# Altium footprint library Connectors THD.PcbLib: 631 footprints (part 4 of 46)
Each footprint in its own frame and in the unit in brackets; x right, y up, seen from the top. Pads: shape width x height; smd on the part's side, far side on the other; paste and mask are expansions set on the pad; w line width, h text height; cw(c..) or ccw(c..) is an arc to the next point about the centre after c.
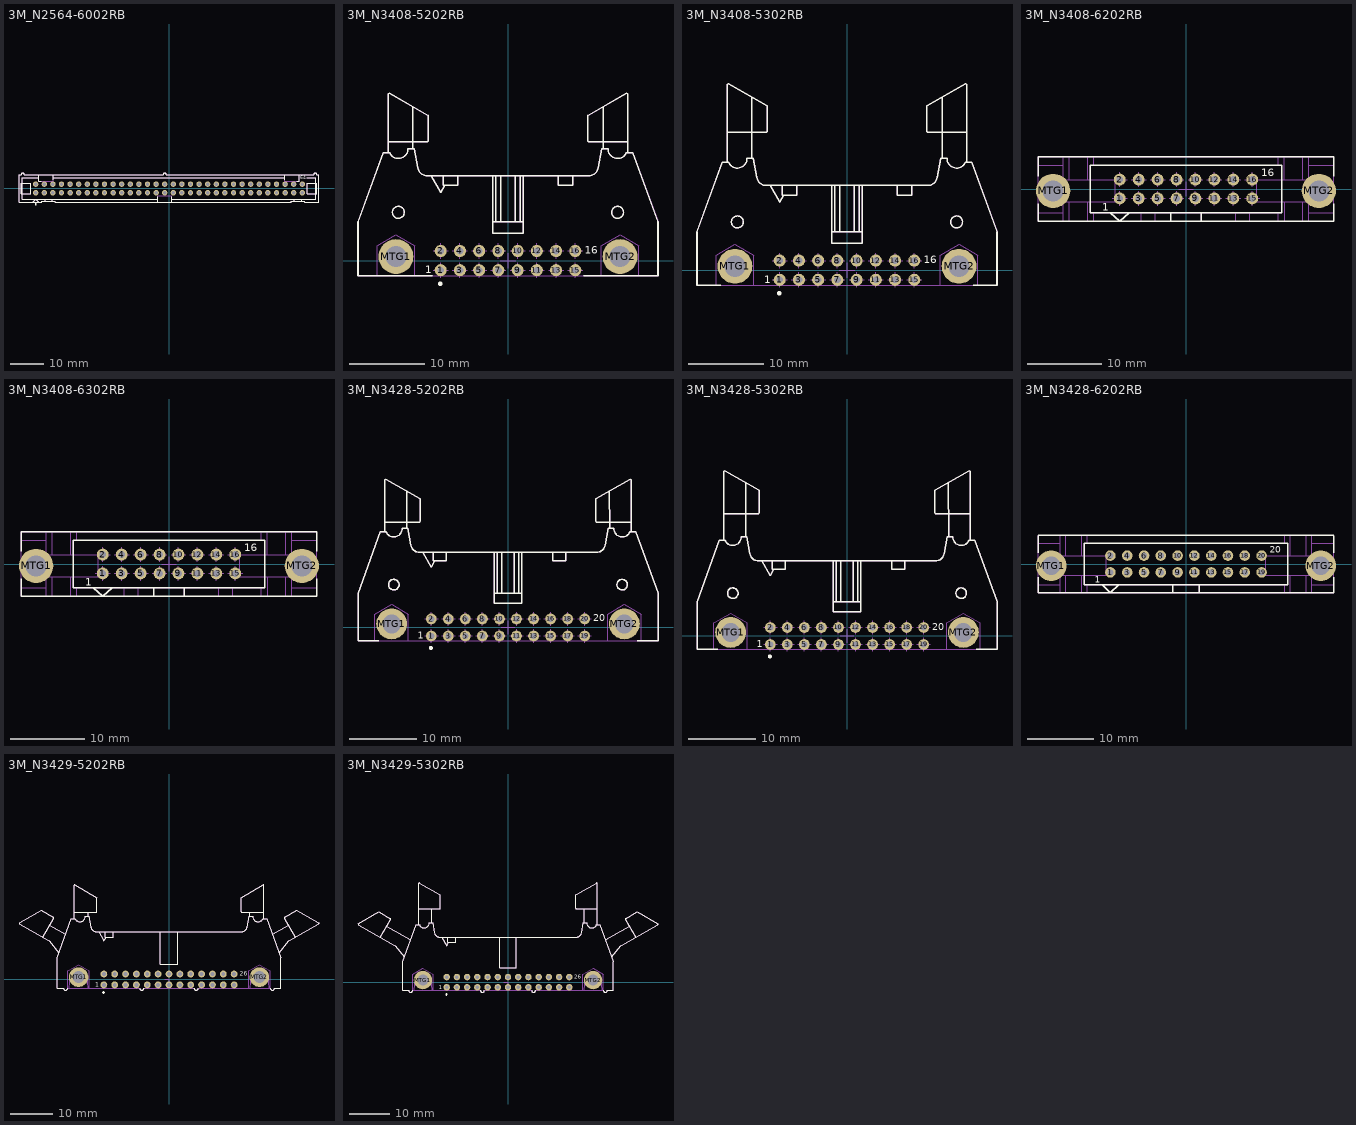
[diagram p3: the footprints below, top view; thin cyan lines are the x and y axes]

## 3M_N2564-6002RB [mm] "64 Contacts - Straight .100\" x .100\" Low Profile Four-Wall Header"
height 10.03
pads (64):
  round 1.6 hole 1: 1(-39.37,-1.27) 2(-39.37,1.27) 3(-36.83,-1.27) 4(-36.83,1.27) 5(-34.29,-1.27) 6(-34.29,1.27) 7(-31.75,-1.27) 8(-31.75,1.27) 9(-29.21,-1.27) 10(-29.21,1.27) 11(-26.67,-1.27) 12(-26.67,1.27) 13(-24.13,-1.27) 14(-24.13,1.27) 15(-21.59,-1.27) 16(-21.59,1.27) 17(-19.05,-1.27) 18(-19.05,1.27) 19(-16.51,-1.27) 20(-16.51,1.27) 21(-13.97,-1.27) 22(-13.97,1.27) 23(-11.43,-1.27) 24(-11.43,1.27) 25(-8.89,-1.27) 26(-8.89,1.27) 27(-6.35,-1.27) 28(-6.35,1.27) 29(-3.81,-1.27) 30(-3.81,1.27) 31(-1.27,-1.27) 32(-1.27,1.27) 33(1.27,-1.27) 34(1.27,1.27) 35(3.81,-1.27) 36(3.81,1.27) 37(6.35,-1.27) 38(6.35,1.27) 39(8.89,-1.27) 40(8.89,1.27) 41(11.43,-1.27) 42(11.43,1.27) 43(13.97,-1.27) 44(13.97,1.27) 45(16.51,-1.27) 46(16.51,1.27) 47(19.05,-1.27) 48(19.05,1.27) 49(21.59,-1.27) 50(21.59,1.27) 51(24.13,-1.27) 52(24.13,1.27) 53(26.67,-1.27) 54(26.67,1.27) 55(29.21,-1.27) 56(29.21,1.27) 57(31.75,-1.27) 58(31.75,1.27) 59(34.29,-1.27) 60(34.29,1.27) 61(36.83,-1.27) 62(36.83,1.27) 63(39.37,-1.27) 64(39.37,1.27)
Top Overlay:
  circle w0.3: c-39.37,-4.699 r0.15
  lines w0.2: -43.282,-1.603 -40.869,-1.603 -40.869,1.603 -43.282,1.603 ; -43.282,-1.524 -43.586,-1.524 -43.586,1.524 -43.282,1.524 ; -40.234,-4.064 -39.37,-3.2 -38.506,-4.064 ; -38.418,3.15 -43.282,3.15 -43.282,-3.2 -3.366,-3.2 ; -38.418,4.064 -38.418,2.159 -37.709,2.159 ; -36.601,-3.835 -36.601,-3.2 ; -34.519,-3.835 -34.519,-3.2 ; -34.227,2.518 -34.227,4.064 ; -34.227,3.15 34.227,3.15 ; -3.366,-4.064 -3.366,-2.438 ; 0.826,-4.064 0.826,-2.438 ; 0.826,-3.2 43.282,-3.2 43.282,3.15 40.64,3.15 ; 34.227,2.518 34.227,4.064 ; 37.059,-3.835 37.059,-3.2 ; 37.709,2.159 38.418,2.159 38.418,4.064 ; 39.141,-3.835 39.141,-3.2 ; 43.282,-1.603 40.869,-1.603 40.869,1.603 43.282,1.603 ; 43.282,-1.524 43.586,-1.524 43.586,1.524 43.282,1.524 ; -44.298,-4.064 -37.592,-4.064 -37.592,-3.835 -33.528,-3.835 -33.528,-4.064 36.068,-4.064 36.068,-3.835 40.132,-3.835 40.132,-4.064 44.298,-4.064 44.298,4.064 43.637,4.064 ccw(c43.18,4.064) 42.723,4.064 -0.813,4.064 ccw(c-1.27,4.064) -1.727,4.064 -42.723,4.064 ccw(c-43.18,4.064) -43.637,4.064 -44.298,4.064 -44.298,-4.064
  text "64" at 38.735,2.667 h1.02
Mechanical 14:
  lines w0.1: -43.282,-1.603 -40.869,-1.603 -40.869,1.603 -43.282,1.603 ; -43.282,-1.524 -43.586,-1.524 -43.586,1.524 -43.282,1.524 ; -40.234,-4.064 -39.37,-3.2 -38.506,-4.064 ; -38.418,3.15 -43.282,3.15 -43.282,-3.2 -3.366,-3.2 ; -38.418,4.064 -38.418,2.159 -34.227,2.159 -34.227,4.064 ; -36.601,-3.835 -36.601,-3.2 ; -34.519,-3.835 -34.519,-3.2 ; -34.227,3.15 34.227,3.15 ; -3.366,-4.064 -3.366,-2.159 0.826,-2.159 0.826,-4.064 ; 0.826,-3.2 43.282,-3.2 43.282,3.15 40.64,3.15 ; 34.227,4.064 34.227,2.159 38.418,2.159 38.418,4.064 ; 37.059,-3.835 37.059,-3.2 ; 39.141,-3.835 39.141,-3.2 ; 43.282,-1.603 40.869,-1.603 40.869,1.603 43.282,1.603 ; 43.282,-1.524 43.586,-1.524 43.586,1.524 43.282,1.524 ; -44.298,-4.064 -37.592,-4.064 -37.592,-3.835 -33.528,-3.835 -33.528,-4.064 36.068,-4.064 36.068,-3.835 40.132,-3.835 40.132,-4.064 44.298,-4.064 44.298,4.064 43.637,4.064 ccw(c43.18,4.064) 42.723,4.064 -0.813,4.064 ccw(c-1.27,4.064) -1.727,4.064 -42.723,4.064 ccw(c-43.18,4.064) -43.637,4.064 -44.298,4.064 -44.298,-4.064
  text "64" at 38.735,2.667 h1.02
3D body: height 9.65, standoff -2.59, extent -44.298,-4.064 44.298,4.572

## 3M_N3408-5202RB [mm] "3M, 3000 Series, 16 Contacts - Pitch 2.54mm - Right Angle Four-Wall Header (Black) With Short Roll Pin Latch/Ejectors"
height 8.6
pads (18):
  round 1.6 hole 0.9: 1(-8.89,-1.27) 2(-8.89,1.27) 3(-6.35,-1.27) 4(-6.35,1.27) 5(-3.81,-1.27) 6(-3.81,1.27) 7(-1.27,-1.27) 8(-1.27,1.27) 9(1.27,-1.27) 10(1.27,1.27) 11(3.81,-1.27) 12(3.81,1.27) 13(6.35,-1.27) 14(6.35,1.27) 15(8.89,-1.27) 16(8.89,1.27)
  round 4.6 hole 2.8: MTG1(-14.796,0.533) MTG2(14.796,0.533)
Top Overlay:
  circle w0.2: c14.478,6.375 r0.787
  circle w0.2: c-14.478,6.375 r0.787
  circle w0.3: c-8.963,-3.048 r0.15
  lines w0.2: -15.799,14.249 -15.799,22.024 -15.646,22.112 -10.541,19.164 -10.541,15.799 -10.643,15.697 -15.799,15.697 ; -12.573,14.757 -12.573,20.337 ; -10.154,11.201 -8.884,9.002 -8.347,9.931 ; -10,-2.007 -19.812,-2.007 -19.812,5.105 -16.484,14.249 -15.642,14.249 ccw(c-14.478,14.757) -13.208,14.757 -12.366,14.757 -11.924,12.251 ccw(c-10.673,12.471) -10.673,11.201 10.673,11.201 ccw(c10.673,12.471) 11.924,12.251 12.366,14.757 13.208,14.757 ccw(c14.478,14.757) 15.642,14.249 16.484,14.249 19.812,5.105 19.812,-2.007 10,-2.007 ; -8.579,11.201 -8.579,9.931 -6.661,9.931 -6.668,11.201 ; -2.032,5.105 2.032,5.105 ; -2.032,11.201 -2.032,3.581 2.032,3.581 2.032,11.201 ; -1.587,5.105 -1.587,11.201 ; -0.953,5.105 -0.953,11.201 ; 0.953,5.105 0.953,11.201 ; 1.587,5.105 1.587,11.201 ; 6.668,11.201 6.661,9.931 8.579,9.931 8.573,11.201 ; 12.58,14.757 12.58,20.341 ; 15.799,14.249 15.799,22.024 15.646,22.112 10.541,19.164 10.541,15.799 10.643,15.697 15.799,15.697
  text "1" at -10.922,-1.7 h1.02
  text "16" at 10.15,0.889 h1.02
Mechanical 8:
  lines w0.1: -15.796,0.533 -14.796,0.533 ; -14.796,-0.467 -14.796,0.533 ; -14.796,1.533 -14.796,0.533 ; -13.796,0.533 -14.796,0.533 ; -9.89,-1.27 -8.89,-1.27 ; -9.89,1.27 -8.89,1.27 ; -8.89,-2.27 -8.89,-1.27 ; -8.89,-0.27 -8.89,-1.27 ; -8.89,0.27 -8.89,1.27 ; -8.89,2.27 -8.89,1.27 ; -7.89,-1.27 -8.89,-1.27 ; -7.89,1.27 -8.89,1.27 ; -7.35,-1.27 -6.35,-1.27 ; -7.35,1.27 -6.35,1.27 ; -6.35,-2.27 -6.35,-1.27 ; -6.35,-0.27 -6.35,-1.27 ; -6.35,0.27 -6.35,1.27 ; -6.35,2.27 -6.35,1.27 ; -5.35,-1.27 -6.35,-1.27 ; -5.35,1.27 -6.35,1.27 ; -4.81,-1.27 -3.81,-1.27 ; -4.81,1.27 -3.81,1.27 ; -3.81,-2.27 -3.81,-1.27 ; -3.81,-0.27 -3.81,-1.27 ; -3.81,0.27 -3.81,1.27 ; -3.81,2.27 -3.81,1.27 ; -2.81,-1.27 -3.81,-1.27 ; -2.81,1.27 -3.81,1.27 ; -2.27,-1.27 -1.27,-1.27 ; -2.27,1.27 -1.27,1.27 ; -1.27,-2.27 -1.27,-1.27 ; -1.27,-0.27 -1.27,-1.27 ; -1.27,0.27 -1.27,1.27 ; -1.27,2.27 -1.27,1.27 ; -1,0 0,0 ; -0.27,-1.27 -1.27,-1.27 ; -0.27,1.27 -1.27,1.27 ; 0,-1 0,0 ; 0,1 0,0 ; 0.27,-1.27 1.27,-1.27 ; 0.27,1.27 1.27,1.27 ; 1,0 0,0 ; 1.27,-2.27 1.27,-1.27 ; 1.27,-0.27 1.27,-1.27 ; 1.27,0.27 1.27,1.27 ; 1.27,2.27 1.27,1.27 ; 2.27,-1.27 1.27,-1.27 ; 2.27,1.27 1.27,1.27 ; 2.81,-1.27 3.81,-1.27 ; 2.81,1.27 3.81,1.27 ; 3.81,-2.27 3.81,-1.27 ; 3.81,-0.27 3.81,-1.27 ; 3.81,0.27 3.81,1.27 ; 3.81,2.27 3.81,1.27 ; 4.81,-1.27 3.81,-1.27 ; 4.81,1.27 3.81,1.27 ; 5.35,-1.27 6.35,-1.27 ; 5.35,1.27 6.35,1.27 ; 6.35,-2.27 6.35,-1.27 ; 6.35,-0.27 6.35,-1.27 ; 6.35,0.27 6.35,1.27 ; 6.35,2.27 6.35,1.27 ; 7.35,-1.27 6.35,-1.27 ; 7.35,1.27 6.35,1.27 ; 7.89,-1.27 8.89,-1.27 ; 7.89,1.27 8.89,1.27 ; 8.89,-2.27 8.89,-1.27 ; 8.89,-0.27 8.89,-1.27 ; 8.89,0.27 8.89,1.27 ; 8.89,2.27 8.89,1.27 ; 9.89,-1.27 8.89,-1.27 ; 9.89,1.27 8.89,1.27 ; 13.796,0.533 14.796,0.533 ; 14.796,-0.467 14.796,0.533 ; 14.796,1.533 14.796,0.533 ; 15.796,0.533 14.796,0.533
Mechanical 14:
  circle w0.1: c-14.796,0.533 r1.27
  circle w0.1: c14.796,0.533 r1.27
  circle w0.1: c14.478,6.375 r0.787
  circle w0.1: c-14.478,6.375 r0.787
  lines w0.1: -17.297,-2.007 -17.297,1.978 -14.796,3.422 -12.294,1.978 -12.294,-2.007 ; -15.799,14.249 -15.799,22.024 -15.646,22.112 -10.541,19.164 -10.541,15.799 -10.643,15.697 -15.799,15.697 ; -12.573,14.757 -12.573,20.337 ; -10.154,11.201 -8.884,9.002 -8.347,9.931 ; -8.579,11.201 -8.579,9.931 -6.661,9.931 -6.668,11.201 ; -2.032,5.105 2.032,5.105 ; -2.032,11.201 -2.032,3.581 2.032,3.581 2.032,11.201 ; -1.587,5.105 -1.587,11.201 ; -0.953,5.105 -0.953,11.201 ; 0.953,5.105 0.953,11.201 ; 1.587,5.105 1.587,11.201 ; 6.668,11.201 6.661,9.931 8.579,9.931 8.573,11.201 ; 12.294,-2.007 12.294,1.978 14.796,3.422 17.297,1.978 17.297,-2.007 ; 12.58,20.341 12.597,14.757 ; 15.799,14.249 15.799,22.024 15.646,22.112 10.541,19.164 10.541,15.799 10.643,15.697 15.799,15.697 ; -19.812,-2.007 19.812,-2.007 19.812,5.105 16.484,14.249 15.642,14.249 cw(c14.478,14.757) 13.208,14.757 12.366,14.757 11.924,12.251 cw(c10.673,12.471) 10.673,11.201 -10.673,11.201 cw(c-10.673,12.471) -11.924,12.251 -12.366,14.757 -13.208,14.757 cw(c-14.478,14.757) -15.642,14.249 -16.484,14.249 -19.812,5.105 -19.812,-2.007
  text "1" at -10.922,-1.7 h1.02
  text "16" at 10.15,0.889 h1.02
3D body: height 8.64, standoff -3.94, extent -19.812,-2.007 19.812,22.125

## 3M_N3408-5302RB [mm] "3M, 3000 Series, 16 Contacts - Pitch 2.54mm - Right Angle Four-Wall Header (Black) With Long Roll Pin Latch/Ejectors"
height 8.6
pads (18):
  round 1.6 hole 0.9: 1(-8.89,-1.27) 2(-8.89,1.27) 3(-6.35,-1.27) 4(-6.35,1.27) 5(-3.81,-1.27) 6(-3.81,1.27) 7(-1.27,-1.27) 8(-1.27,1.27) 9(1.27,-1.27) 10(1.27,1.27) 11(3.81,-1.27) 12(3.81,1.27) 13(6.35,-1.27) 14(6.35,1.27) 15(8.89,-1.27) 16(8.89,1.27)
  round 4.6 hole 2.8: MTG1(-14.796,0.533) MTG2(14.796,0.533)
Top Overlay:
  circle w0.3: c-8.963,-3.048 r0.15
  circle w0.2: c-14.478,6.375 r0.787
  circle w0.2: c14.478,6.375 r0.787
  lines w0.2: -16.7,-2.007 -19.812,-2.007 -19.812,5.105 -16.484,14.249 -15.642,14.249 ccw(c-14.478,14.757) -13.208,14.757 -12.366,14.757 -11.924,12.251 ccw(c-10.673,12.471) -10.673,11.201 10.673,11.201 ccw(c10.673,12.471) 11.924,12.251 12.366,14.757 13.208,14.757 ccw(c14.478,14.757) 15.642,14.249 16.484,14.249 19.812,5.105 19.812,-2.007 16.7,-2.007 ; -15.799,14.249 -15.799,24.561 -15.646,24.649 -10.541,21.702 -10.541,18.336 -10.643,18.235 -15.799,18.235 ; -12.573,14.757 -12.573,22.875 ; -10.154,11.201 -8.884,9.002 -8.347,9.931 ; -8.579,11.201 -8.579,9.931 -6.661,9.931 -6.668,11.201 ; -2.032,5.105 2.032,5.105 ; -2.032,11.201 -2.032,3.581 2.032,3.581 2.032,11.201 ; -1.587,5.105 -1.587,11.201 ; -0.953,5.105 -0.953,11.201 ; 0.953,5.105 0.953,11.201 ; 1.587,5.105 1.587,11.201 ; 6.668,11.201 6.661,9.931 8.579,9.931 8.573,11.201 ; 12.573,14.757 12.573,22.875 ; 15.799,14.249 15.799,24.561 15.646,24.649 10.541,21.702 10.541,18.336 10.643,18.235 15.799,18.235
  text "16" at 10.15,0.889 h1.02
  text "1" at -10.922,-1.7 h1.02
Mechanical 8:
  lines w0.1: -15.796,0.533 -14.796,0.533 ; -14.796,-0.467 -14.796,0.533 ; -14.796,1.533 -14.796,0.533 ; -13.796,0.533 -14.796,0.533 ; -9.89,-1.27 -8.89,-1.27 ; -9.89,1.27 -8.89,1.27 ; -8.89,-2.27 -8.89,-1.27 ; -8.89,-0.27 -8.89,-1.27 ; -8.89,0.27 -8.89,1.27 ; -8.89,2.27 -8.89,1.27 ; -7.89,-1.27 -8.89,-1.27 ; -7.89,1.27 -8.89,1.27 ; -7.35,-1.27 -6.35,-1.27 ; -7.35,1.27 -6.35,1.27 ; -6.35,-2.27 -6.35,-1.27 ; -6.35,-0.27 -6.35,-1.27 ; -6.35,0.27 -6.35,1.27 ; -6.35,2.27 -6.35,1.27 ; -5.35,-1.27 -6.35,-1.27 ; -5.35,1.27 -6.35,1.27 ; -4.81,-1.27 -3.81,-1.27 ; -4.81,1.27 -3.81,1.27 ; -3.81,-2.27 -3.81,-1.27 ; -3.81,-0.27 -3.81,-1.27 ; -3.81,0.27 -3.81,1.27 ; -3.81,2.27 -3.81,1.27 ; -2.81,-1.27 -3.81,-1.27 ; -2.81,1.27 -3.81,1.27 ; -2.27,-1.27 -1.27,-1.27 ; -2.27,1.27 -1.27,1.27 ; -1.27,-2.27 -1.27,-1.27 ; -1.27,-0.27 -1.27,-1.27 ; -1.27,0.27 -1.27,1.27 ; -1.27,2.27 -1.27,1.27 ; -1,0 0,0 ; -0.27,-1.27 -1.27,-1.27 ; -0.27,1.27 -1.27,1.27 ; 0,-1 0,0 ; 0,1 0,0 ; 0.27,-1.27 1.27,-1.27 ; 0.27,1.27 1.27,1.27 ; 1,0 0,0 ; 1.27,-2.27 1.27,-1.27 ; 1.27,-0.27 1.27,-1.27 ; 1.27,0.27 1.27,1.27 ; 1.27,2.27 1.27,1.27 ; 2.27,-1.27 1.27,-1.27 ; 2.27,1.27 1.27,1.27 ; 2.81,-1.27 3.81,-1.27 ; 2.81,1.27 3.81,1.27 ; 3.81,-2.27 3.81,-1.27 ; 3.81,-0.27 3.81,-1.27 ; 3.81,0.27 3.81,1.27 ; 3.81,2.27 3.81,1.27 ; 4.81,-1.27 3.81,-1.27 ; 4.81,1.27 3.81,1.27 ; 5.35,-1.27 6.35,-1.27 ; 5.35,1.27 6.35,1.27 ; 6.35,-2.27 6.35,-1.27 ; 6.35,-0.27 6.35,-1.27 ; 6.35,0.27 6.35,1.27 ; 6.35,2.27 6.35,1.27 ; 7.35,-1.27 6.35,-1.27 ; 7.35,1.27 6.35,1.27 ; 7.89,-1.27 8.89,-1.27 ; 7.89,1.27 8.89,1.27 ; 8.89,-2.27 8.89,-1.27 ; 8.89,-0.27 8.89,-1.27 ; 8.89,0.27 8.89,1.27 ; 8.89,2.27 8.89,1.27 ; 9.89,-1.27 8.89,-1.27 ; 9.89,1.27 8.89,1.27 ; 13.796,0.533 14.796,0.533 ; 14.796,-0.467 14.796,0.533 ; 14.796,1.533 14.796,0.533 ; 15.796,0.533 14.796,0.533
Mechanical 14:
  circle w0.1: c-14.478,6.375 r0.787
  circle w0.1: c14.478,6.375 r0.787
  circle w0.1: c14.796,0.533 r1.27
  circle w0.1: c-14.796,0.533 r1.27
  lines w0.1: -17.297,-2.007 -17.297,1.978 -14.796,3.422 -12.294,1.978 -12.294,-2.007 ; -15.799,14.249 -15.799,24.561 -15.646,24.649 -10.541,21.702 -10.541,18.336 -10.643,18.235 -15.799,18.235 ; -12.573,14.757 -12.573,22.875 ; -10.154,11.201 -8.884,9.002 -8.347,9.931 ; -8.579,11.201 -8.579,9.931 -6.661,9.931 -6.668,11.201 ; -2.032,5.105 2.032,5.105 ; -2.032,11.201 -2.032,3.581 2.032,3.581 2.032,11.201 ; -1.587,5.105 -1.587,11.201 ; -0.953,5.105 -0.953,11.201 ; 0.953,5.105 0.953,11.201 ; 1.587,5.105 1.587,11.201 ; 6.668,11.201 6.661,9.931 8.579,9.931 8.573,11.201 ; 12.294,-2.007 12.294,1.978 14.796,3.422 17.297,1.978 17.297,-2.007 ; 12.573,22.875 12.597,14.757 ; 15.799,14.249 15.799,24.561 15.646,24.649 10.541,21.702 10.541,18.336 10.643,18.235 15.799,18.235 ; -19.812,-2.007 -19.812,5.105 -16.484,14.249 -15.642,14.249 ccw(c-14.478,14.757) -13.208,14.757 -12.366,14.757 -11.924,12.251 ccw(c-10.673,12.471) -10.673,11.201 10.673,11.201 ccw(c10.673,12.471) 11.924,12.251 12.366,14.757 13.208,14.757 ccw(c14.478,14.757) 15.642,14.249 16.484,14.249 19.812,5.105 19.812,-2.007 -19.812,-2.007
  text "16" at 10.15,0.889 h1.02
  text "1" at -10.922,-1.7 h1.02
3D body: height 8.64, standoff -3.94, extent -19.812,-2.007 19.812,24.663

## 3M_N3408-6202RB [mm] "3M, 3000 Series, 16 Contacts - Pitch 2.54mm - Straight Four-Wall Header (Black) With Short Roll Pin Latch/Ejectors"
height 24.6
pads (18):
  round 1.6 hole 0.9: 1(-8.89,-1.27) 2(-8.89,1.27) 3(-6.35,-1.27) 4(-6.35,1.27) 5(-3.81,-1.27) 6(-3.81,1.27) 7(-1.27,-1.27) 8(-1.27,1.27) 9(1.27,-1.27) 10(1.27,1.27) 11(3.81,-1.27) 12(3.81,1.27) 13(6.35,-1.27) 14(6.35,1.27) 15(8.89,-1.27) 16(8.89,1.27)
  round 4.6 hole 2.8: MTG1(-17.83,-0.254) MTG2(17.83,-0.254)
Top Overlay:
  lines w0.2: -19.812,-2 -19.812,-4.318 19.812,-4.318 19.812,-2 ; -19.812,1.7 -19.812,4.3 ; -19.812,4.318 19.812,4.318 ; -2.032,-4.318 -2.032,-3.175 ; 2.032,-4.318 2.032,-3.175 ; 19.812,1.7 19.812,4.3 ; -12.827,-3.175 12.827,-3.175 12.827,3.175 -12.827,3.175 -12.827,-3.175 ; -10.16,-3.175 -7.62,-3.175 -8.89,-4.318 -10.16,-3.175
  text "1" at -11.227,-2.921 h1.02
  text "16" at 10.125,1.727 h1.02
Mechanical 8:
  lines w0.1: -18.83,-0.254 -17.83,-0.254 ; -17.83,-1.254 -17.83,-0.254 ; -17.83,0.746 -17.83,-0.254 ; -16.83,-0.254 -17.83,-0.254 ; -9.89,-1.27 -8.89,-1.27 ; -9.89,1.27 -8.89,1.27 ; -8.89,-2.27 -8.89,-1.27 ; -8.89,-0.27 -8.89,-1.27 ; -8.89,0.27 -8.89,1.27 ; -8.89,2.27 -8.89,1.27 ; -7.89,-1.27 -8.89,-1.27 ; -7.89,1.27 -8.89,1.27 ; -7.35,-1.27 -6.35,-1.27 ; -7.35,1.27 -6.35,1.27 ; -6.35,-2.27 -6.35,-1.27 ; -6.35,-0.27 -6.35,-1.27 ; -6.35,0.27 -6.35,1.27 ; -6.35,2.27 -6.35,1.27 ; -5.35,-1.27 -6.35,-1.27 ; -5.35,1.27 -6.35,1.27 ; -4.81,-1.27 -3.81,-1.27 ; -4.81,1.27 -3.81,1.27 ; -3.81,-2.27 -3.81,-1.27 ; -3.81,-0.27 -3.81,-1.27 ; -3.81,0.27 -3.81,1.27 ; -3.81,2.27 -3.81,1.27 ; -2.81,-1.27 -3.81,-1.27 ; -2.81,1.27 -3.81,1.27 ; -2.27,-1.27 -1.27,-1.27 ; -2.27,1.27 -1.27,1.27 ; -1.27,-2.27 -1.27,-1.27 ; -1.27,-0.27 -1.27,-1.27 ; -1.27,0.27 -1.27,1.27 ; -1.27,2.27 -1.27,1.27 ; -1,0 0,0 ; -0.27,-1.27 -1.27,-1.27 ; -0.27,1.27 -1.27,1.27 ; 0,-1 0,0 ; 0,1 0,0 ; 0.27,-1.27 1.27,-1.27 ; 0.27,1.27 1.27,1.27 ; 1,0 0,0 ; 1.27,-2.27 1.27,-1.27 ; 1.27,-0.27 1.27,-1.27 ; 1.27,0.27 1.27,1.27 ; 1.27,2.27 1.27,1.27 ; 2.27,-1.27 1.27,-1.27 ; 2.27,1.27 1.27,1.27 ; 2.81,-1.27 3.81,-1.27 ; 2.81,1.27 3.81,1.27 ; 3.81,-2.27 3.81,-1.27 ; 3.81,-0.27 3.81,-1.27 ; 3.81,0.27 3.81,1.27 ; 3.81,2.27 3.81,1.27 ; 4.81,-1.27 3.81,-1.27 ; 4.81,1.27 3.81,1.27 ; 5.35,-1.27 6.35,-1.27 ; 5.35,1.27 6.35,1.27 ; 6.35,-2.27 6.35,-1.27 ; 6.35,-0.27 6.35,-1.27 ; 6.35,0.27 6.35,1.27 ; 6.35,2.27 6.35,1.27 ; 7.35,-1.27 6.35,-1.27 ; 7.35,1.27 6.35,1.27 ; 7.89,-1.27 8.89,-1.27 ; 7.89,1.27 8.89,1.27 ; 8.89,-2.27 8.89,-1.27 ; 8.89,-0.27 8.89,-1.27 ; 8.89,0.27 8.89,1.27 ; 8.89,2.27 8.89,1.27 ; 9.89,-1.27 8.89,-1.27 ; 9.89,1.27 8.89,1.27 ; 16.844,-0.254 17.844,-0.254 ; 17.844,-1.254 17.844,-0.254 ; 17.844,0.746 17.844,-0.254 ; 18.844,-0.254 17.844,-0.254
Mechanical 14:
  circle w0.1: c17.844,-0.254 r1.27
  circle w0.1: c-17.844,-0.254 r1.27
  lines w0.1: -19.812,-3.175 -16.484,-3.175 ; -16.484,-4.318 -16.484,-1.727 -9.525,-1.727 -9.525,1.27 -16.484,1.27 -16.484,4.318 ; -15.642,-4.318 -15.642,-1.727 ; -15.642,1.27 -15.642,4.318 ; -13.209,-4.318 -13.208,-1.727 ; -12.827,-1.727 -12.827,-3.175 12.827,-3.175 12.827,-1.727 ; -12.827,1.27 -12.827,3.175 12.827,3.175 12.827,1.27 ; -6.039,-4.318 -6.039,-3.175 ; -4.121,-4.318 -4.121,-3.175 ; -2.032,-4.318 -2.032,-3.175 ; 2.032,-4.318 2.032,-3.175 ; 6.661,-4.318 6.661,-3.175 ; 8.579,-4.318 8.579,-3.175 ; 12.366,-4.318 12.366,-3.175 ; 12.366,3.175 12.366,4.318 ; 13.208,1.27 13.208,4.318 ; 13.249,-4.318 13.249,-1.727 ; 15.642,-4.318 15.642,-1.727 ; 15.642,1.27 15.642,4.318 ; 16.484,-4.318 16.484,-1.727 9.525,-1.727 9.525,1.27 16.484,1.27 16.484,4.318 ; 16.484,-3.175 19.812,-3.175 ; 16.484,3.175 19.812,3.175 ; -19.812,-4.318 -19.812,4.318 19.812,4.318 19.812,-4.318 -19.812,-4.318 ; -19.812,3.175 -16.484,3.175 -19.812,3.175 ; -19.368,-1.134 -17.844,-2.014 -16.32,-1.134 -16.32,0.626 -17.844,1.506 -19.368,0.626 -19.368,-1.134 ; -13.208,1.27 -13.208,4.318 -13.208,1.27 ; -12.366,-4.318 -12.366,-3.175 -12.366,-4.318 ; -12.366,3.175 -12.366,4.318 -12.366,3.175 ; 16.32,-1.134 17.844,-2.014 19.368,-1.134 19.368,0.626 17.844,1.506 16.32,0.626 16.32,-1.134
  text "1" at -11.227,-2.921 h1.02
  text "16" at 10.125,1.727 h1.02
3D body: height 24.64, standoff -3.94, extent -19.812,-4.318 19.812,4.318

## 3M_N3408-6302RB [mm] "3M, 3000 Series, 16 Contacts - Pitch 2.54mm - Straight Four-Wall Header (Black) With Long Roll Pin Latch/Ejectors"
height 27.2
pads (18):
  round 1.6 hole 0.9: 1(-8.89,-1.27) 2(-8.89,1.27) 3(-6.35,-1.27) 4(-6.35,1.27) 5(-3.81,-1.27) 6(-3.81,1.27) 7(-1.27,-1.27) 8(-1.27,1.27) 9(1.27,-1.27) 10(1.27,1.27) 11(3.81,-1.27) 12(3.81,1.27) 13(6.35,-1.27) 14(6.35,1.27) 15(8.89,-1.27) 16(8.89,1.27)
  round 4.6 hole 2.8: MTG1(-17.83,-0.254) MTG2(17.83,-0.254)
Top Overlay:
  lines w0.2: -19.812,-2 -19.812,-4.318 19.812,-4.318 19.812,-2 ; -19.812,1.7 -19.812,4.3 ; -19.812,4.318 19.812,4.318 ; -2.032,-4.318 -2.032,-3.175 ; 2.032,-4.318 2.032,-3.175 ; 19.812,1.7 19.812,4.3 ; -12.827,-3.175 12.827,-3.175 12.827,3.175 -12.827,3.175 -12.827,-3.175 ; -10.16,-3.175 -7.62,-3.175 -8.89,-4.318 -10.16,-3.175
  text "1" at -11.227,-2.921 h1.02
  text "16" at 10.125,1.727 h1.02
Mechanical 8:
  lines w0.1: -18.83,-0.254 -17.83,-0.254 ; -17.83,-1.254 -17.83,-0.254 ; -17.83,0.746 -17.83,-0.254 ; -16.83,-0.254 -17.83,-0.254 ; -9.89,-1.27 -8.89,-1.27 ; -9.89,1.27 -8.89,1.27 ; -8.89,-2.27 -8.89,-1.27 ; -8.89,-0.27 -8.89,-1.27 ; -8.89,0.27 -8.89,1.27 ; -8.89,2.27 -8.89,1.27 ; -7.89,-1.27 -8.89,-1.27 ; -7.89,1.27 -8.89,1.27 ; -7.35,-1.27 -6.35,-1.27 ; -7.35,1.27 -6.35,1.27 ; -6.35,-2.27 -6.35,-1.27 ; -6.35,-0.27 -6.35,-1.27 ; -6.35,0.27 -6.35,1.27 ; -6.35,2.27 -6.35,1.27 ; -5.35,-1.27 -6.35,-1.27 ; -5.35,1.27 -6.35,1.27 ; -4.81,-1.27 -3.81,-1.27 ; -4.81,1.27 -3.81,1.27 ; -3.81,-2.27 -3.81,-1.27 ; -3.81,-0.27 -3.81,-1.27 ; -3.81,0.27 -3.81,1.27 ; -3.81,2.27 -3.81,1.27 ; -2.81,-1.27 -3.81,-1.27 ; -2.81,1.27 -3.81,1.27 ; -2.27,-1.27 -1.27,-1.27 ; -2.27,1.27 -1.27,1.27 ; -1.27,-2.27 -1.27,-1.27 ; -1.27,-0.27 -1.27,-1.27 ; -1.27,0.27 -1.27,1.27 ; -1.27,2.27 -1.27,1.27 ; -1,0 0,0 ; -0.27,-1.27 -1.27,-1.27 ; -0.27,1.27 -1.27,1.27 ; 0,-1 0,0 ; 0,1 0,0 ; 0.27,-1.27 1.27,-1.27 ; 0.27,1.27 1.27,1.27 ; 1,0 0,0 ; 1.27,-2.27 1.27,-1.27 ; 1.27,-0.27 1.27,-1.27 ; 1.27,0.27 1.27,1.27 ; 1.27,2.27 1.27,1.27 ; 2.27,-1.27 1.27,-1.27 ; 2.27,1.27 1.27,1.27 ; 2.81,-1.27 3.81,-1.27 ; 2.81,1.27 3.81,1.27 ; 3.81,-2.27 3.81,-1.27 ; 3.81,-0.27 3.81,-1.27 ; 3.81,0.27 3.81,1.27 ; 3.81,2.27 3.81,1.27 ; 4.81,-1.27 3.81,-1.27 ; 4.81,1.27 3.81,1.27 ; 5.35,-1.27 6.35,-1.27 ; 5.35,1.27 6.35,1.27 ; 6.35,-2.27 6.35,-1.27 ; 6.35,-0.27 6.35,-1.27 ; 6.35,0.27 6.35,1.27 ; 6.35,2.27 6.35,1.27 ; 7.35,-1.27 6.35,-1.27 ; 7.35,1.27 6.35,1.27 ; 7.89,-1.27 8.89,-1.27 ; 7.89,1.27 8.89,1.27 ; 8.89,-2.27 8.89,-1.27 ; 8.89,-0.27 8.89,-1.27 ; 8.89,0.27 8.89,1.27 ; 8.89,2.27 8.89,1.27 ; 9.89,-1.27 8.89,-1.27 ; 9.89,1.27 8.89,1.27 ; 16.844,-0.254 17.844,-0.254 ; 17.844,-1.254 17.844,-0.254 ; 17.844,0.746 17.844,-0.254 ; 18.844,-0.254 17.844,-0.254
Mechanical 14:
  circle w0.1: c17.844,-0.254 r1.27
  circle w0.1: c-17.844,-0.254 r1.27
  lines w0.1: -19.812,-3.175 -16.484,-3.175 ; -16.484,-4.318 -16.484,-1.727 -9.525,-1.727 -9.525,1.27 -16.484,1.27 -16.484,4.318 ; -15.642,-4.318 -15.642,-1.727 ; -15.642,1.27 -15.642,4.318 ; -13.209,-4.318 -13.208,-1.727 ; -12.827,-1.727 -12.827,-3.175 12.827,-3.175 12.827,-1.727 ; -12.827,1.27 -12.827,3.175 12.827,3.175 12.827,1.27 ; -6.039,-4.318 -6.039,-3.175 ; -4.121,-4.318 -4.121,-3.175 ; -2.032,-4.318 -2.032,-3.175 ; 2.032,-4.318 2.032,-3.175 ; 6.661,-4.318 6.661,-3.175 ; 8.579,-4.318 8.579,-3.175 ; 12.366,-4.318 12.366,-3.175 ; 12.366,3.175 12.366,4.318 ; 13.208,1.27 13.208,4.318 ; 13.249,-4.318 13.249,-1.727 ; 15.642,-4.318 15.642,-1.727 ; 15.642,1.27 15.642,4.318 ; 16.484,-4.318 16.484,-1.727 9.525,-1.727 9.525,1.27 16.484,1.27 16.484,4.318 ; 16.484,-3.175 19.812,-3.175 ; 16.484,3.175 19.812,3.175 ; -19.812,-4.318 -19.812,4.318 19.812,4.318 19.812,-4.318 -19.812,-4.318 ; -19.812,3.175 -16.484,3.175 -19.812,3.175 ; -19.368,-1.134 -17.844,-2.014 -16.32,-1.134 -16.32,0.626 -17.844,1.506 -19.368,0.626 -19.368,-1.134 ; -13.208,1.27 -13.208,4.318 -13.208,1.27 ; -12.366,-4.318 -12.366,-3.175 -12.366,-4.318 ; -12.366,3.175 -12.366,4.318 -12.366,3.175 ; 16.32,-1.134 17.844,-2.014 19.368,-1.134 19.368,0.626 17.844,1.506 16.32,0.626 16.32,-1.134